# Altium footprint library Vowstar_Basic_Device.PcbLib: 170 footprints (part 2 of 11)
Each footprint in its own frame and in the unit in brackets; x right, y up, seen from the top. Pads: shape width x height; smd on the part's side, far side on the other; paste and mask are expansions set on the pad; w line width, h text height; cw(c..) or ccw(c..) is an arc to the next point about the centre after c.
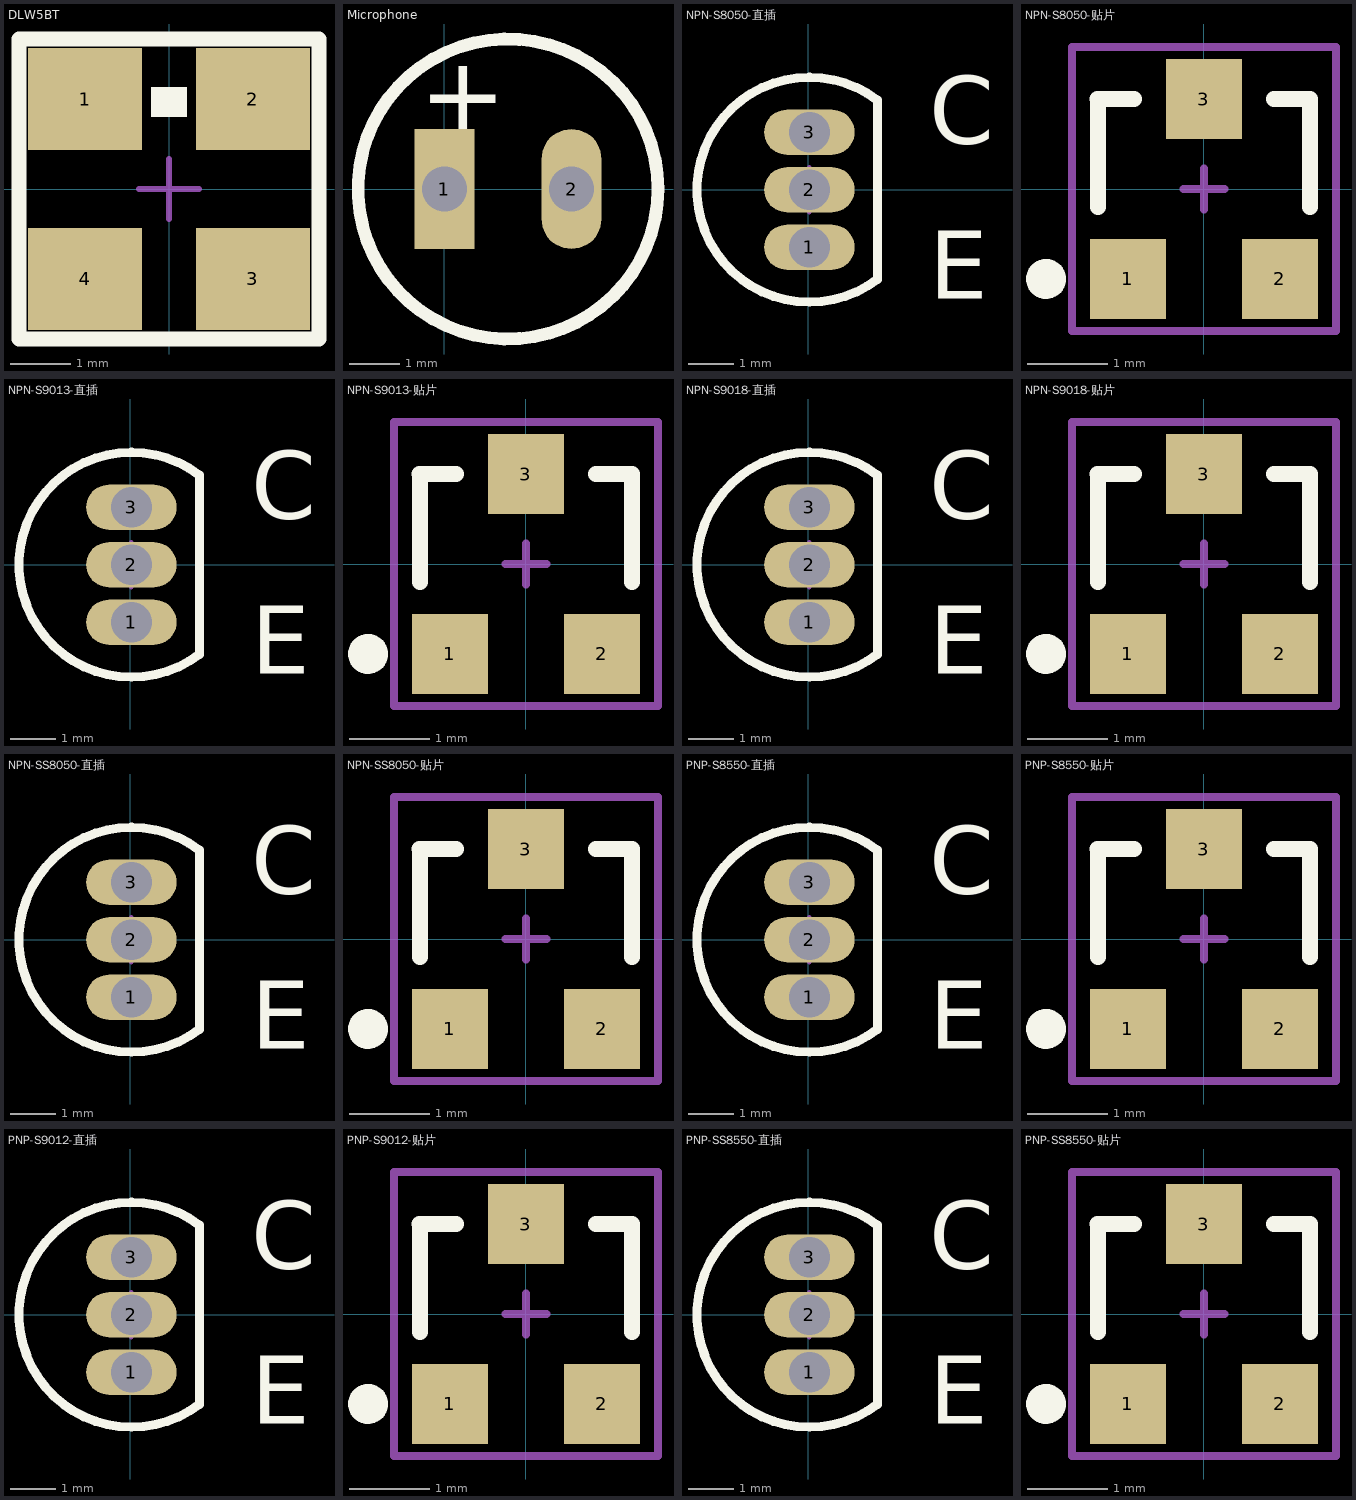
[diagram p1: the footprints below, top view; thin cyan lines are the x and y axes]

## DLW5BT [mm] "DLW5BT Series (2020 Size) Common Mode Choke Coil Wire Wound Type for Large Current"
height 2.5
pads (4):
  rect 1.9x1.7 smd: 1(-1.4,1.5) 2(1.4,1.5) 3(1.4,-1.5) 4(-1.4,-1.5)
Top Overlay:
  rectangle: -0.3,1.2 0.3,1.7
  lines w0.254: -2.5,-2.5 -2.5,2.5 2.5,2.5 2.5,-2.5 -2.5,-2.5
Mechanical 13:
  lines w0.1: -2.5,-2.5 2.5,-2.5 2.5,2.5 -2.5,2.5 -2.5,-2.5
Mechanical 15:
  lines w0.1: -0.5,0 0.5,0 ; 0,-0.5 0,0.5 ; -2.5,-2.5 -2.5,2.5 2.5,2.5 2.5,-2.5 -2.5,-2.5
3D body "User Library-DLW5BT.STEP": height 2.45, standoff 0, extent -2.5,-2.5 2.5,2.5

## Microphone [mm] "Microphone"
pads (2):
  rect 1.2x2.4 hole 0.9: 1(0,0)
  oval 1.2x2.4 hole 0.9: 2(2.54,0)
Top Overlay:
  circle w0.254: c1.27,0 r3
  text "+" at -0.508,1.143 h1.52
3D body "User Library-Microphone-6.0mm-SMD.step": height 5.2, standoff -0.2, extent -1.73,-3.048 4.27,2.952

## NPN-S8050-直插 [mm] "NPN-S8050-直插"
pads (3):
  oval 2x1 hole 0.9: 1(0.024,-1.27) 2(0.024,0) 3(0.024,1.27)
Top Overlay:
  lines w0.2: 1.524,-1.98 cw(c0.024,0) 1.524,1.98 1.524,-1.98
  text "E" at 2.667,-2.413 h1.5
  text "C" at 2.667,1.016 h1.5
Mechanical 15:
  lines w0.1: -0.476,0 0.524,0 ; 0.024,-0.5 0.024,0.5
3D body "User Library-TO-92 (TO-226) Straight Lead.STEP": height 10, standoff -3, extent -2.591,-2.613 1.613,2.613

## NPN-S8050-贴片 [mm] "NPN-S8050-贴片"
pads (3):
  rect 0.95x1 smd: 1(-0.95,-1.125) 2(0.95,-1.125) 3(0,1.125)
Top Overlay:
  circle w0.25: c-1.975,-1.125 r0.125
  lines w0.2: -1.328,1.125 -0.875,1.125 ; -1.325,-0.225 -1.325,1.125 ; 0.875,1.125 1.325,1.125 1.325,-0.225
Mechanical 15:
  lines w0.1: -0.254,0 0.254,0 ; 0,-0.254 0,0.254 ; -1.651,-1.778 -1.651,1.778 1.651,1.778 1.651,-1.778 -1.651,-1.778
3D body "User Library-SOT23-3.step": height 1.3, standoff 0, extent -1.448,-1.397 1.452,1.403

## NPN-S9013-直插 [mm] "NPN-S9013-直插"
pads (3):
  oval 2x1 hole 0.9: 1(0.024,-1.27) 2(0.024,0) 3(0.024,1.27)
Top Overlay:
  lines w0.2: 1.524,-1.98 cw(c0.024,0) 1.524,1.98 1.524,-1.98
  text "E" at 2.667,-2.413 h1.5
  text "C" at 2.667,1.016 h1.5
Mechanical 15:
  lines w0.1: -0.476,0 0.524,0 ; 0.024,-0.5 0.024,0.5
3D body "User Library-TO-92 (TO-226) Straight Lead.STEP": height 10, standoff -3, extent -2.591,-2.613 1.613,2.613

## NPN-S9013-贴片 [mm] "NPN-S9013-贴片"
pads (3):
  rect 0.95x1 smd: 1(-0.95,-1.125) 2(0.95,-1.125) 3(0,1.125)
Top Overlay:
  circle w0.25: c-1.975,-1.125 r0.125
  lines w0.2: -1.328,1.125 -0.875,1.125 ; -1.325,-0.225 -1.325,1.125 ; 0.875,1.125 1.325,1.125 1.325,-0.225
Mechanical 15:
  lines w0.1: -0.254,0 0.254,0 ; 0,-0.254 0,0.254 ; -1.651,-1.778 -1.651,1.778 1.651,1.778 1.651,-1.778 -1.651,-1.778
3D body "User Library-SOT23-3.step": height 1.3, standoff 0, extent -1.448,-1.397 1.452,1.403

## NPN-S9018-直插 [mm] "NPN-S9018-直插"
pads (3):
  oval 2x1 hole 0.9: 1(0.024,-1.27) 2(0.024,0) 3(0.024,1.27)
Top Overlay:
  lines w0.2: 1.524,-1.98 cw(c0.024,0) 1.524,1.98 1.524,-1.98
  text "E" at 2.667,-2.413 h1.5
  text "C" at 2.667,1.016 h1.5
Mechanical 15:
  lines w0.1: -0.476,0 0.524,0 ; 0.024,-0.5 0.024,0.5
3D body "User Library-TO-92 (TO-226) Straight Lead.STEP": height 10, standoff -3, extent -2.591,-2.613 1.613,2.613

## NPN-S9018-贴片 [mm] "NPN-S9018-贴片"
pads (3):
  rect 0.95x1 smd: 1(-0.95,-1.125) 2(0.95,-1.125) 3(0,1.125)
Top Overlay:
  circle w0.25: c-1.975,-1.125 r0.125
  lines w0.2: -1.328,1.125 -0.875,1.125 ; -1.325,-0.225 -1.325,1.125 ; 0.875,1.125 1.325,1.125 1.325,-0.225
Mechanical 15:
  lines w0.1: -0.254,0 0.254,0 ; 0,-0.254 0,0.254 ; -1.651,-1.778 1.651,-1.778 1.651,1.778 -1.651,1.778 -1.651,-1.778
3D body "User Library-SOT23-3.step": height 1.3, standoff 0, extent -1.448,-1.397 1.452,1.403

## NPN-SS8050-直插 [mm] "NPN-SS8050-直插"
pads (3):
  oval 2x1 hole 0.9: 1(0.024,-1.27) 2(0.024,0) 3(0.024,1.27)
Top Overlay:
  lines w0.2: 1.524,-1.98 cw(c0.024,0) 1.524,1.98 1.524,-1.98
  text "E" at 2.667,-2.413 h1.5
  text "C" at 2.667,1.016 h1.5
Mechanical 15:
  lines w0.1: -0.476,0 0.524,0 ; 0.024,-0.5 0.024,0.5
3D body "User Library-TO-92 (TO-226) Straight Lead.STEP": height 10, standoff -3, extent -2.591,-2.613 1.613,2.613

## NPN-SS8050-贴片 [mm] "NPN-SS8050-贴片"
pads (3):
  rect 0.95x1 smd: 1(-0.95,-1.125) 2(0.95,-1.125) 3(0,1.125)
Top Overlay:
  circle w0.25: c-1.975,-1.125 r0.125
  lines w0.2: -1.328,1.125 -0.875,1.125 ; -1.325,-0.225 -1.325,1.125 ; 0.875,1.125 1.325,1.125 1.325,-0.225
Mechanical 15:
  lines w0.1: -0.254,0 0.254,0 ; 0,-0.254 0,0.254 ; -1.651,-1.778 -1.651,1.778 1.651,1.778 1.651,-1.778 -1.651,-1.778
3D body "User Library-SOT23-3.step": height 1.3, standoff 0, extent -1.448,-1.397 1.452,1.403

## PNP-S8550-直插 [mm] "PNP-S8550-直插"
pads (3):
  oval 2x1 hole 0.9: 1(0.024,-1.27) 2(0.024,0) 3(0.024,1.27)
Top Overlay:
  lines w0.2: 1.524,-1.98 cw(c0.024,0) 1.524,1.98 1.524,-1.98
  text "C" at 2.667,1.016 h1.5
  text "E" at 2.667,-2.413 h1.5
Mechanical 15:
  lines w0.1: -0.476,0 0.524,0 ; 0.024,-0.5 0.024,0.5
3D body "User Library-TO-92 (TO-226) Straight Lead.STEP": height 10, standoff -3, extent -2.591,-2.613 1.613,2.613

## PNP-S8550-贴片 [mm] "PNP-S8550-贴片"
pads (3):
  rect 0.95x1 smd: 1(-0.95,-1.125) 2(0.95,-1.125) 3(0,1.125)
Top Overlay:
  circle w0.25: c-1.975,-1.125 r0.125
  lines w0.2: -1.328,1.125 -0.875,1.125 ; -1.325,-0.225 -1.325,1.125 ; 0.875,1.125 1.325,1.125 1.325,-0.225
Mechanical 15:
  lines w0.1: -0.254,0 0.254,0 ; 0,-0.254 0,0.254 ; -1.651,-1.778 -1.651,1.778 1.651,1.778 1.651,-1.778 -1.651,-1.778
3D body "User Library-SOT23-3.step": height 1.3, standoff 0, extent -1.448,-1.397 1.452,1.403

## PNP-S9012-直插 [mm] "PNP-S9012-直插"
pads (3):
  oval 2x1 hole 0.9: 1(0.024,-1.27) 2(0.024,0) 3(0.024,1.27)
Top Overlay:
  lines w0.2: 1.524,-1.98 cw(c0.024,0) 1.524,1.98 1.524,-1.98
  text "C" at 2.667,1.016 h1.5
  text "E" at 2.667,-2.413 h1.5
Mechanical 15:
  lines w0.1: -0.476,0 0.524,0 ; 0.024,-0.5 0.024,0.5
3D body "User Library-TO-92 (TO-226) Straight Lead.STEP": height 10, standoff -3, extent -2.591,-2.613 1.613,2.613

## PNP-S9012-贴片 [mm] "PNP-S9012-贴片"
pads (3):
  rect 0.95x1 smd: 1(-0.95,-1.125) 2(0.95,-1.125) 3(0,1.125)
Top Overlay:
  circle w0.25: c-1.975,-1.125 r0.125
  lines w0.2: -1.328,1.125 -0.875,1.125 ; -1.325,-0.225 -1.325,1.125 ; 0.875,1.125 1.325,1.125 1.325,-0.225
Mechanical 15:
  lines w0.1: -0.254,0 0.254,0 ; 0,-0.254 0,0.254 ; -1.651,-1.778 1.651,-1.778 1.651,1.778 -1.651,1.778 -1.651,-1.778
3D body "User Library-SOT23-3.step": height 1.3, standoff 0, extent -1.448,-1.397 1.452,1.403

## PNP-SS8550-直插 [mm] "PNP-SS8550-直插"
pads (3):
  oval 2x1 hole 0.9: 1(0.024,-1.27) 2(0.024,0) 3(0.024,1.27)
Top Overlay:
  lines w0.2: 1.524,-1.98 cw(c0.024,0) 1.524,1.98 1.524,-1.98
  text "E" at 2.667,-2.413 h1.5
  text "C" at 2.667,1.016 h1.5
Mechanical 15:
  lines w0.1: -0.476,0 0.524,0 ; 0.024,-0.5 0.024,0.5
3D body "User Library-TO-92 (TO-226) Straight Lead.STEP": height 10, standoff -3, extent -2.591,-2.613 1.613,2.613

## PNP-SS8550-贴片 [mm] "PNP-SS8550-贴片"
pads (3):
  rect 0.95x1 smd: 1(-0.95,-1.125) 2(0.95,-1.125) 3(0,1.125)
Top Overlay:
  circle w0.25: c-1.975,-1.125 r0.125
  lines w0.2: -1.328,1.125 -0.875,1.125 ; -1.325,-0.225 -1.325,1.125 ; 0.875,1.125 1.325,1.125 1.325,-0.225
Mechanical 15:
  lines w0.1: -0.254,0 0.254,0 ; 0,-0.254 0,0.254 ; -1.651,-1.778 1.651,-1.778 1.651,1.778 -1.651,1.778 -1.651,-1.778
3D body "User Library-SOT23-3.step": height 1.3, standoff 0, extent -1.448,-1.397 1.452,1.403